# Altium integrated library Sajad_Altium_Library.IntLib: 390 symbols (part 2 of 3) (continued)
## Relay (continued)
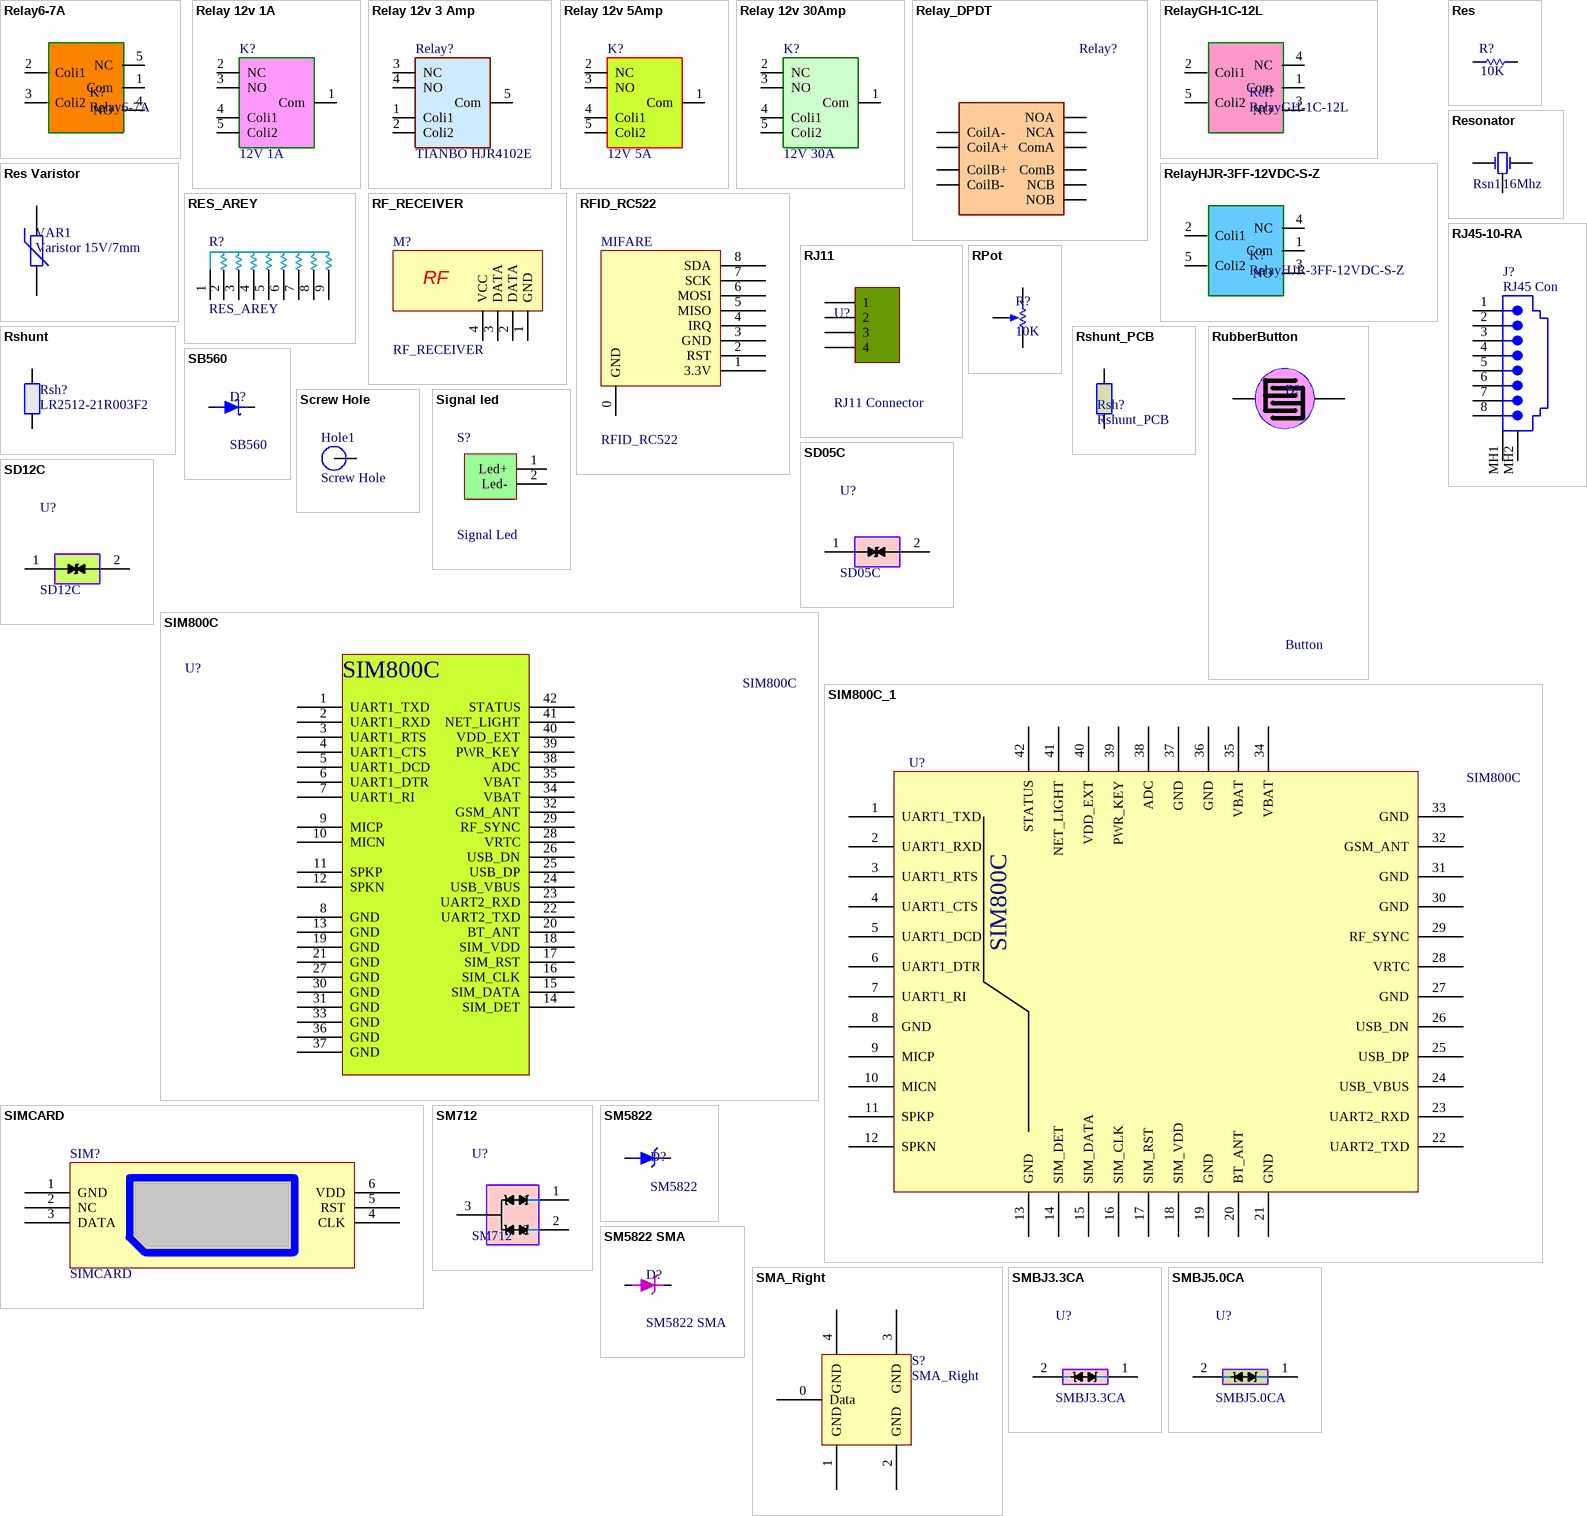
[diagram p12: symbols Relay6-7A to SMBJ5.0CA]

## Relay6-7A
designator K?
Single-Pole Dual-Throw Relay
footprint Relay Mini Milon
pins: 1 Com (power), 2 Coli1 (power), 3 Coli2 (power), 4 NO (power), 5 NC (power)

## Relay 12v 1A
designator K?, comment 12V 1A
12V 1A RELAY
footprint RELAY_12_CMD
pins: 1 Com (power), 2 NC (power), 3 NO (power), 4 Coli1 (power), 5 Coli2 (power)

## Relay 12v 3 Amp
designator Relay?, comment TIANBO HJR4102E
TIANBO 3A 12V RELAY
footprint TIANBO HJR4102E (TIANBO HJR4102E 12 v 3 A relay)
pins: 1 Coli1 (power), 2 Coli2 (power), 3 NC (power), 4 NO (power), 5 Com (power)

## Relay 12v 5Amp
designator K?, comment 12V 5A
12V 5A RELAY
footprint RELAY_12_10
pins: 1 Com (power), 2 NC (power), 3 NO (power), 4 Coli1 (power), 5 Coli2 (power)

## Relay 12v 30Amp
designator K?, comment 12V 30A
12V 30A RELAY
footprint RELAY_12_30
pins: 1 Com (power), 2 NC (power), 3 NO (power), 4 Coli1 (power), 5 Coli2 (power)

## Relay_DPDT
designator Relay?, comment JQC-16F  (value not drawn)
footprint RELAY_DOUBLE (JQC-16F)
pins: 1 CoilA+, 2 CoilA-, 3 NOA (power), 4 NCA (power), 5 ComA (power), 6 CoilB+, 7 CoilB-, 8 NOB (power), 9 NCB (power), 10 ComB (power)

## RelayGH-1C-12L
designator Rel?
HJR-3FF-12VDC-S-Z
footprint GH-1C-12L
pins: 1 Com (power), 2 Coli1 (power), 3 NO (power), 4 NC (power), 5 Coli2 (power)

## RelayHJR-3FF-12VDC-S-Z
designator K?
HJR-3FF-12VDC-S-Z
footprint HJR-3FF-12VDC-S-Z
pins: 1 Com (power), 2 Coli1 (power), 3 NO (power), 4 NC (power), 5 Coli2 (power)

## Res
designator R?, comment 10K
Resistor; Published: 8-Jun-2000; LatestRevisionDate: 17-Jul-2002; LatestRevisionNote: Re-released for DXP Platform.; PackageReference: AXIAL-0.3; Publisher: Altium Limited
footprint 0805
footprint 0603
footprint 1206_Res (1206 footprint)
footprint 0805 - big
footprint AXIAL-0.4 res (Axial Device, Thru-Hole; 2 Leads; 0.4 in Pin Spacing)
footprint RES20-16.5X6.5 (Resistor, Axial; Body 16.5 x 6.5 mm (LxDia. max), Lead Dia. 0.85 mm (max))
footprint 2512 (Footprint not found)
footprint 1225
footprint RES20 (Resistor, Axial; Body 16.5 x 6.5 mm (LxDia. max), Lead Dia. 0.85 mm (max))
footprint 0603 -sm
footprint AXIAL_KHAM-1W
footprint 0805_Medium
footprint RES_5W
pins: 1, 2

## Res Varistor
designator VAR1, comment Varistor 15V/7mm
Varistor (Voltage-Sensitive Resistor); Published: 24-Mar-1999; LatestRevisionDate: 29-May-2009; LatestRevisionNote: IPC-7351 Footprint Added.; PackageVersion: Mar-2003; PackageReference: 6-0805; Publisher: Altium Limited; PackageDescription: Chip Resistor 0805 Case Size; Code_IPC: RESC2012
footprint NTC0.3/.7
footprint 6-0805_L (Chip Resistor, Body 2.0x1.2mm, IPC High Density)
footprint 6-0805_M (Chip Resistor, Body 2.0x1.2mm, IPC Low Density)
pins: 1, 2

## RES_AREY
designator R?
footprint SIP9
pins: 1, 2, 3, 4, 5, 6, 7, 8, 9

## Resonator
designator Rsn1, comment 16Mhz
footprint RESONATOR
pins: 1 OSC1, 2 Gnd, 3 OSC2

## RF_RECEIVER
designator M?
footprint RF_RX
footprint RF_RX2
pins: 1 GND, 2 DATA, 3 DATA, 4 VCC
text: RF

## RFID_RC522
designator MIFARE
footprint RFID_RC522
pins: 0 GND, 1 3.3V, 2 RST, 3 GND, 4 IRQ, 5 MISO, 6 MOSI, 7 SCK, 8 SDA

## RJ11
designator U?, comment RJ11 Connector
RJ11; LatestRevisionDate: 17-Jul-2002; LatestRevisionNote: Re-released for DXP Platform.; Publisher: Altium Limited
footprint RJ11 (RJ11 CONNECTOR)
pins: 1, 2, 3, 4

## RJ45-10-RA
designator J?, comment RJ45 Con
Right Angle, Standard Profile, External Shield PCB Jack; Design Item Id: CON-RA-RJ45-95122-2881
footprint RJ-45 Connector (LAN Conector)
pins: 1, 2, 3, 4, 5, 6, 7, 8, MH1 Shield, MH2 Shield

## RPot
designator R?, comment 10K
Potentiometer
footprint SMD Pot (SMD Potentiometer)
footprint MultiTurn Pot (MultiTurn Potentiometer)
footprint Connector1x3 (Connector; Header; 3 Position)
footprint Potentiometer (potentiometer standing)
footprint POT4MM-2
pins: 1, 2, 3

## Rshunt
designator Rsh?, comment LR2512-21R003F2
Published: 8-Jun-2000; LatestRevisionDate: 17-Jul-2002; LatestRevisionNote: Re-released for DXP Platform.; PackageReference: AXIAL-0.3; Publisher: Altium Limited
footprint LR2512-21R003F2
pins: 1, 2

## Rshunt_PCB
designator Rsh?
Value: 3mOhm
footprint PCB_Shunt (3miliOhm)
footprint PCB_Shunt10m (10miliOhm)
pins: 1, 2

## RubberButton
designator B?, comment Button
Rubber button
footprint Button_Pad
pins: 1, 2

## SB560
designator D?
5 Amp Schottky Diode
footprint DO-201AD (Diode, Axial; Body 9.5 x 5.6 mm (LxDia. max), Lead Dia. 1.32 mm (max))
pins: 1 A, 2 K

## Screw Hole
designator Hole1  (no BOM)
footprint Hole_3mm-5mm
footprint Hole_4mm-5.5mm
pins: 1
2 alternate drawings of the same symbol

## SD05C
designator U?
Single Line TVS Diode for ESD  Protection
footprint 0805_MediumCap
pins: 1 "Speed", 2 "Speed"

## SD12C
designator U?
Single Line TVS Diode for ESD  Protection
footprint 0805_MediumCap
pins: 1 "Speed", 2 "Speed"

## Signal led
designator S?, comment Signal Led
footprint Signal LED (Signal_led)
pins: 1 Led+, 2 Led-

## SIM800C
designator U?
footprint SIM800C
pins: 1 UART1_TXD, 2 UART1_RXD, 3 UART1_RTS, 4 UART1_CTS, 5 UART1_DCD, 6 UART1_DTR, 7 UART1_RI, 8 GND, 9 MICP, 10 MICN, 11 SPKP, 12 SPKN, 13 GND, 14 SIM_DET, 15 SIM_DATA, 16 SIM_CLK, 17 SIM_RST, 18 SIM_VDD, 19 GND, 20 BT_ANT, 21 GND, 22 UART2_TXD, 23 UART2_RXD, 24 USB_VBUS, 25 USB_DP, 26 USB_DN, 27 GND, 28 VRTC, 29 RF_SYNC, 30 GND, 31 GND, 32 GSM_ANT, 33 GND, 34 VBAT, 35 VBAT, 36 GND, 37 GND, 38 ADC, 39 PWR_KEY, 40 VDD_EXT, 41 NET_LIGHT, 42 STATUS

## SIM800C_1
designator U?, comment SIM800C
footprint SIM800C
pins: 1 UART1_TXD, 2 UART1_RXD, 3 UART1_RTS, 4 UART1_CTS, 5 UART1_DCD, 6 UART1_DTR, 7 UART1_RI, 8 GND, 9 MICP, 10 MICN, 11 SPKP, 12 SPKN, 13 GND, 14 SIM_DET, 15 SIM_DATA, 16 SIM_CLK, 17 SIM_RST, 18 SIM_VDD, 19 GND, 20 BT_ANT, 21 GND, 22 UART2_TXD, 23 UART2_RXD, 24 USB_VBUS, 25 USB_DP, 26 USB_DN, 27 GND, 28 VRTC, 29 RF_SYNC, 30 GND, 31 GND, 32 GSM_ANT, 33 GND, 34 VBAT, 35 VBAT, 36 GND, 37 GND, 38 ADC, 39 PWR_KEY, 40 VDD_EXT, 41 NET_LIGHT, 42 STATUS

## SIMCARD
designator SIM?
footprint SIMCARD
pins: 1 GND, 2 NC, 3 DATA, 4 CLK, 5 RST, 6 VDD

## SM712
designator U?
TVS Diode for RS485; Link: http://javanelec.com/productsDetails.aspx?id=1540
footprint SOT23_
pins: 1 "Speed", 2 "Speed", 3 "Speed"

## SM5822
designator D?
3A Schottkey diode 40V
pins: 1 A, 2 K

## SM5822 SMA
designator D?
3 Amp Schottky Rectifier 40V; Link: http://www.javanelec.com/Shops/Index?searchFilter=ss34
footprint DO-214AA (DO-214AA (SMB))
pins: 1 A, 2 K

## SMA_Right
designator S?
footprint SMA_Right
pins: 0 Data, 1 GND, 2 GND, 3 GND, 4 GND

## SMBJ3.3CA
designator U?
TVS Diode for 3.3v; Link: javanElectronic; Price: 2625 Rial
footprint DO-214AC (1N4001-7 SMD DIODE)
pins: 1 "Speed", 2 "Speed"

## SMBJ5.0CA
designator U?
TVS Diode for 5v; Link: javanElectronic; Price: 2625 Rial
footprint DO-214AC (1N4001-7 SMD DIODE)
pins: 1 "Speed", 2 "Speed"

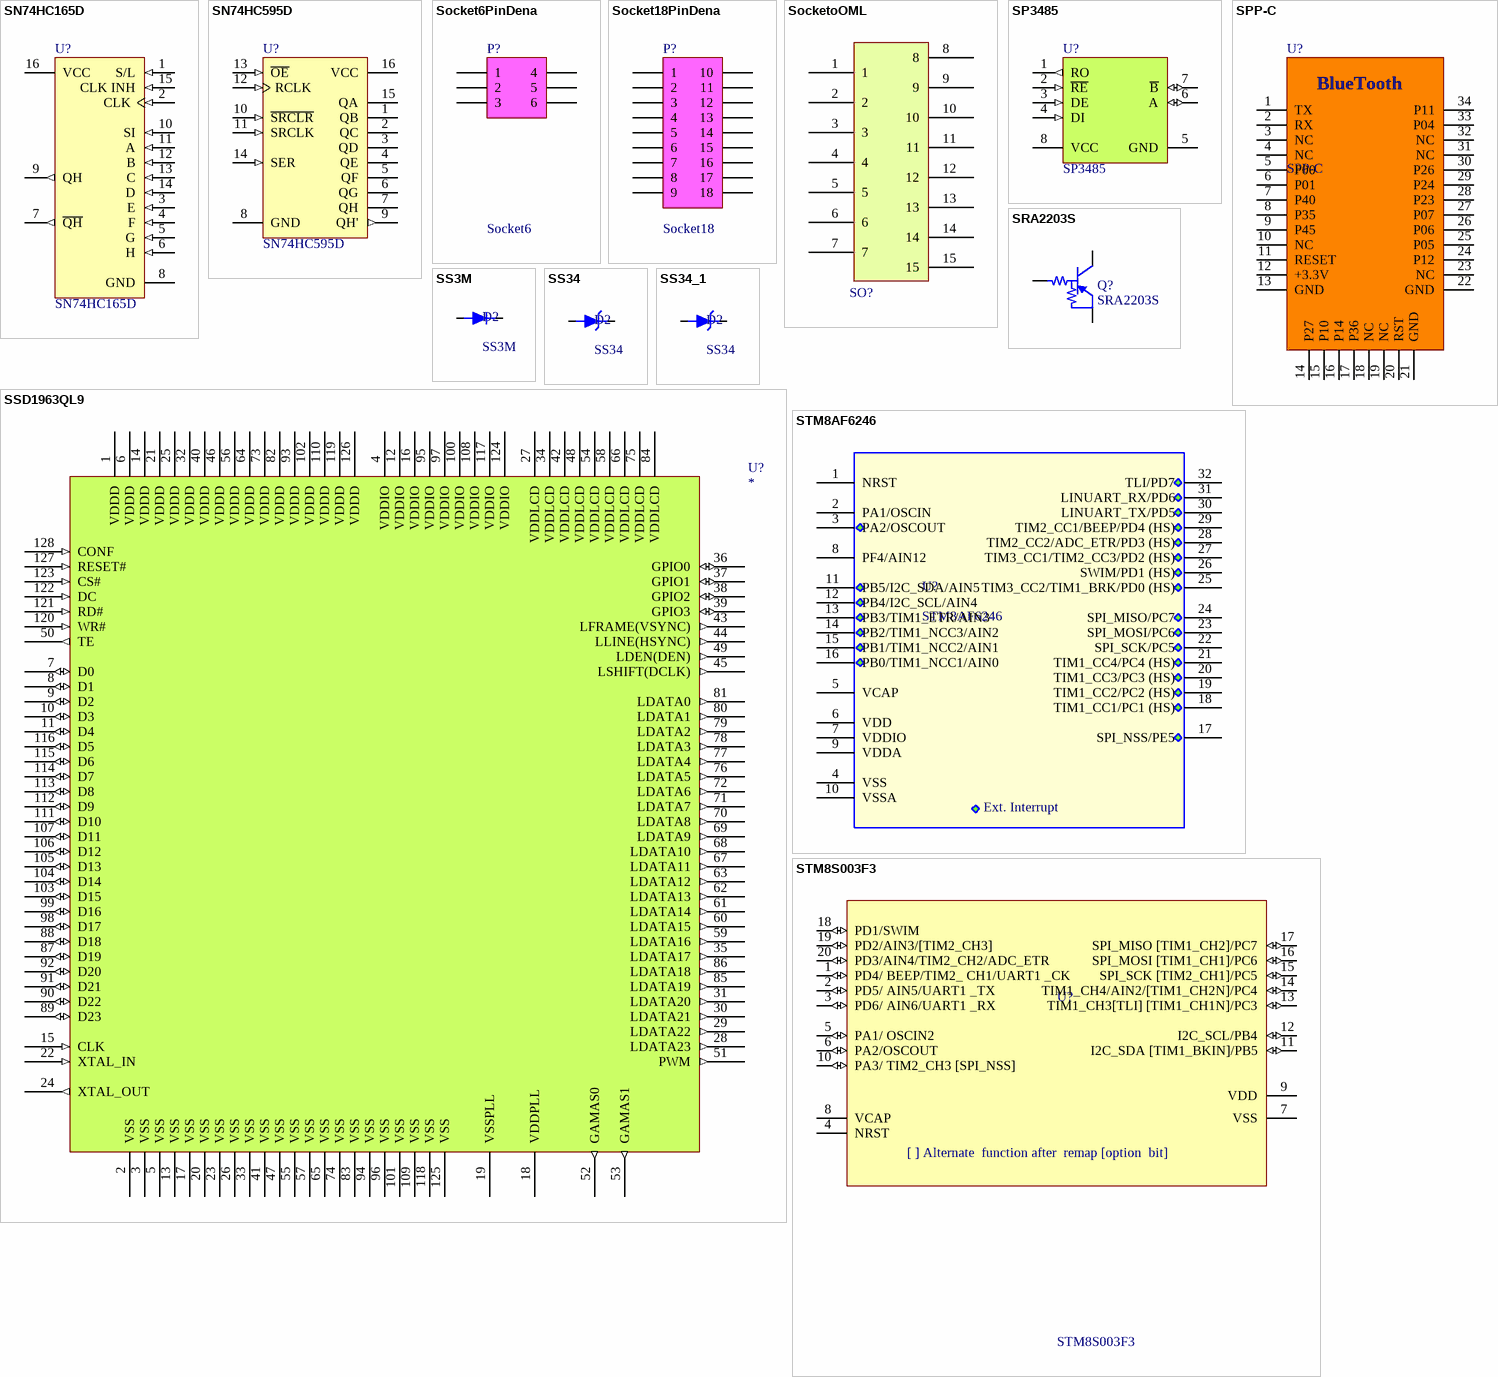
[diagram p13: symbols SN74HC165D to STM8S003F3]

## SN74HC165D
designator U?
8-Bit Parallel-Load Shift Register; Published: 8-Jun-2000; LatestRevisionDate: 13-Apr-2006; LatestRevisionNote: IPC-7351 Footprint Added.; DatasheetVersion: May-1997; PackageVersion: Jan-1998; PackageReference: D016; Publisher: Altium Limited; PackageDescription: 16-Pin Small Outline Integrated Circuit 1.27 mm Pitch; Code_IPC: SOIC127P600-16; ComponentLink1Description: Manufacturer Link; ComponentLink1URL: http://www.ti.com/; ComponentLink2Description: Datasheet; ComponentLink2URL: http://www-s.ti.com/sc/ds/sn74hc165.pdf
footprint SO16
pins: 1 S/L (in), 2 CLK (in), 3 E (in), 4 F (in), 5 G (in), 6 H (in), 7 ~{QH} (out), 8 GND (power), 9 QH (out), 10 SI (in), 11 A (in), 12 B (in), 13 C (in), 14 D (in), 15 CLK INH (in), 16 VCC (power)

## SN74HC595D
designator U?
8-Bit Shift Register with 3-State Output Registers; Published: 8-Jun-2000; LatestRevisionDate: 13-Apr-2006; LatestRevisionNote: IPC-7351 Footprint Added.; DatasheetVersion: May-1997; PackageVersion: Jan-1998; PackageReference: D016; Publisher: Altium Limited; PackageDescription: 16-Pin Small Outline Integrated Circuit 1.27 mm Pitch; Code_IPC: SOIC127P600-16; ComponentLink1Description: Manufacturer Link; ComponentLink1URL: http://www.ti.com/; ComponentLink2Description: Datasheet; ComponentLink2URL: http://www-s.ti.com/sc/ds/sn74hc595.pdf
footprint SO16
pins: 1 QB (hiz), 2 QC (hiz), 3 QD (hiz), 4 QE (hiz), 5 QF (hiz), 6 QG (hiz), 7 QH (hiz), 8 GND (power), 9 QH' (out), 10 ~{SRCLR} (in), 11 SRCLK (in), 12 RCLK (in), 13 ~{OE} (in), 14 SER (in), 15 QA (hiz), 16 VCC (power)

## Socket6PinDena
designator P?, comment Socket6
Socket 6 Pin for Dena & Samand
footprint Socket6Pin (for Dena & Samand Mirror)
pins: 1, 2, 3, 4, 5, 6

## Socket18PinDena
designator P?, comment Socket18
Socket 18 Pin for Dena & Samand
footprint Socket18Pin (for Dena & Samand Door)
pins: 1, 2, 3, 4, 5, 6, 7, 8, 9, 10, 11, 12, 13, 14, 15, 16, 17, 18

## SocketoOML
designator SO?, comment Socket  (value not drawn)
footprint SocketoOML
pins: 1, 2, 3, 4, 5, 6, 7, 8, 9, 10, 11, 12, 13, 14, 15

## SP3485
designator U?
+3.3V Low Power Half-Duplex RS-485   Transceiver with 10Mbps Data Rate; PartNumber: DS485M; Manufacturer: National Semiconductor; PackageTopMarking: NSZXTT*DS485*M; PowerWise: N; CompType: Interface IC; Published: 4-Dec-2008; DatasheetVersion: Jul-1998; PackageVersion: revM, May-2009; PackageReference: M08A; Publisher: Altium Limited; PackageDescription: SOIC Narrow, 4.9 x 3.9 x 1.45mm, 8 Lead, 1.27mm Pitch; Supplier 1: Farnell; Supplier Part Number 1: 9490078; RoHS: N; PinCount: 8; Code_JEDEC: MS-012-AA; Code_IPC: SOIC127P600-8; ComponentLink1Description: DS485 Datasheet; ComponentLink1URL: http://www.national.com/ds/DS/DS485.pdf; ComponentLink2Description: DS485 Web Page; ComponentLink2URL: http://www.national.com/pf/DS/DS485.html; ComponentLink3Description: M08A Package Page; ComponentLink3URL: http://www.national.com/packaging/folders/m08a.html
footprint SO8
pins: 1 RO (out), 2 ~{RE} (in), 3 DE (in), 4 DI (in), 5 GND (power), 6 A (io), 7 ~{B} (io), 8 VCC (power)

## SPP-C
designator U?
Bluetooth Serial Module
footprint SPP-C (Bluetooth module footprint)
pins: 1 TX, 2 RX, 3 NC, 4 NC, 5 P00, 6 P01, 7 P40, 8 P35, 9 P45, 10 NC, 11 RESET, 12 +3.3V, 13 GND, 14 P27, 15 P10, 16 P14, 17 P36, 18 NC, 19 NC, 20 RST, 21 GND, 22 GND, 23 NC, 24 P12, 25 P05, 26 P06, 27 P07, 28 P23, 29 P24, 30 P26, 31 NC, 32 NC, 33 P04, 34 P11
text: BlueTooth

## SRA2203S
designator Q?
PNP Silicon Transistor With built-in bias resistors
footprint SOT23_
pins: 1 B, 2 E, 3 C

## SS3M
designator D2
3A Schottkey diode
footprint DIODE - SMC
pins: 1 A, 2 K

## SS34
designator D2
3A Schottkey diode
footprint DIODE - SMC
pins: 1 A, 2 K

## SS34_1
designator D2, comment SS34
3A Schottkey diode
footprint DIODE - SMC
pins: 1 A, 2 K

## SSD1963QL9
designator U?
SSD1963QL9
footprint LQFP128
pins: 1 VDDD, 2 VSS, 3 VSS, 4 VDDIO, 5 VSS, 6 VDDD, 7 D0 (io), 8 D1 (io), 9 D2 (io), 10 D3 (io), 11 D4 (io), 12 VDDIO, 13 VSS, 14 VDDD, 15 CLK (in), 16 VDDIO, 17 VSS, 18 VDDPLL, 19 VSSPLL, 20 VSS, 21 VDDD, 22 XTAL_IN (in), 23 VSS, 24 XTAL_OUT (out), 25 VDDD, 26 VSS, 27 VDDLCD, 28 LDATA23 (out), 29 LDATA22 (out), 30 LDATA21 (out), 31 LDATA20 (out), 32 VDDD, 33 VSS, 34 VDDLCD, 35 LDATA17 (out), 36 GPIO0 (io), 37 GPIO1 (io), 38 GPIO2 (io), 39 GPIO3 (io), 40 VDDD, 41 VSS, 42 VDDLCD, 43 LFRAME(VSYNC) (out), 44 LLINE(HSYNC) (out), 45 LSHIFT(DCLK) (out), 46 VDDD, 47 VSS, 48 VDDLCD, 49 LDEN(DEN) (out), 50 TE (out), 51 PWM (out), 52 GAMAS0 (out), 53 GAMAS1 (out), 54 VDDLCD, 55 VSS, 56 VDDD, 57 VSS, 58 VDDLCD, 59 LDATA16 (out), 60 LDATA15 (out), 61 LDATA14 (out), 62 LDATA13 (out), 63 LDATA12 (out), 64 VDDD, 65 VSS, 66 VDDLCD, 67 LDATA11 (out), 68 LDATA10 (out), 69 LDATA9 (out), 70 LDATA8 (out), 71 LDATA7 (out), 72 LDATA6 (out), 73 VDDD, 74 VSS, 75 VDDLCD, 76 LDATA5 (out), 77 LDATA4 (out), 78 LDATA3 (out), 79 LDATA2 (out), 80 LDATA1 (out), 81 LDATA0 (out), 82 VDDD, 83 VSS, 84 VDDLCD, 85 LDATA19 (out), 86 LDATA18 (out), 87 D19 (io), 88 D18 (io), 89 D23 (io), 90 D22 (io), 91 D21 (io), 92 D20 (io), 93 VDDD, 94 VSS, 95 VDDIO, 96 VSS, 97 VDDIO, 98 D17 (io), 99 D16 (io), 100 VDDIO, 101 VSS, 102 VDDD, 103 D15 (io), 104 D14 (io), 105 D13 (io), 106 D12 (io), 107 D11 (io), 108 VDDIO, 109 VSS, 110 VDDD, 111 D10 (io), 112 D9 (io), 113 D8 (io), 114 D7 (io), 115 D6 (io), 116 D5 (io), 117 VDDIO, 118 VSS, 119 VDDD, 120 WR# (in), 121 RD# (in), 122 DC (in), 123 CS# (in), 124 VDDIO, 125 VSS, 126 VDDD, 127 RESET# (in), 128 CONF (in)

## STM8AF6246
designator U?
footprint LQFP32 (32-Pin Thin Quad Flat Pack 0.8 mm Pitch)
pins: 1 NRST, 2 PA1/OSCIN, 3 PA2/OSCOUT, 4 VSS, 5 VCAP, 6 VDD, 7 VDDIO, 8 PF4/AIN12, 9 VDDA, 10 VSSA, 11 PB5/I2C_SDA/AIN5, 12 PB4/I2C_SCL/AIN4, 13 PB3/TIM1_ETR/AIN3, 14 PB2/TIM1_NCC3/AIN2, 15 PB1/TIM1_NCC2/AIN1, 16 PB0/TIM1_NCC1/AIN0, 17 SPI_NSS/PE5, 18 TIM1_CC1/PC1 (HS), 19 TIM1_CC2/PC2 (HS), 20 TIM1_CC3/PC3 (HS), 21 TIM1_CC4/PC4 (HS), 22 SPI_SCK/PC5, 23 SPI_MOSI/PC6, 24 SPI_MISO/PC7, 25 TIM3_CC2/TIM1_BRK/PD0 (HS), 26 SWIM/PD1 (HS), 27 TIM3_CC1/TIM2_CC3/PD2 (HS), 28 TIM2_CC2/ADC_ETR/PD3 (HS), 29 TIM2_CC1/BEEP/PD4 (HS), 30 LINUART_TX/PD5, 31 LINUART_RX/PD6, 32 TLI/PD7
text: Ext. Interrupt

## STM8S003F3
designator U?
8-Bit ST Microcontroller with 8K Bytes Flash
footprint TSSOP 20 (20-pin, 4.40 mm body, 0.65 mm pitch)
pins: 1 PD4/ BEEP/TIM2_ CH1/UART1 _CK (io), 2 PD5/ AIN5/UART1 _TX (io), 3 PD6/ AIN6/UART1 _RX (io), 4 NRST, 5 PA1/ OSCIN2 (io), 6 PA2/OSCOUT (io), 7 VSS, 8 VCAP, 9 VDD, 10 PA3/ TIM2_CH3 [SPI_NSS] (io), 11 I2C_SDA [TIM1_BKIN]/PB5 (io), 12 I2C_SCL/PB4 (io), 13 TIM1_CH3[TLI] [TIM1_CH1N]/PC3 (io), 14 TIM1_CH4/AIN2/[TIM1_CH2N]/PC4 (io), 15 SPI_SCK [TIM2_CH1]/PC5 (io), 16 SPI_MOSI [TIM1_CH1]/PC6 (io), 17 SPI_MISO [TIM1_CH2]/PC7 (io), 18 PD1/SWIM (io), 19 PD2/AIN3/[TIM2_CH3] (io), 20 PD3/AIN4/TIM2_CH2/ADC_ETR (io)
text: [ ] Alternate  function after  remap [option  bit]

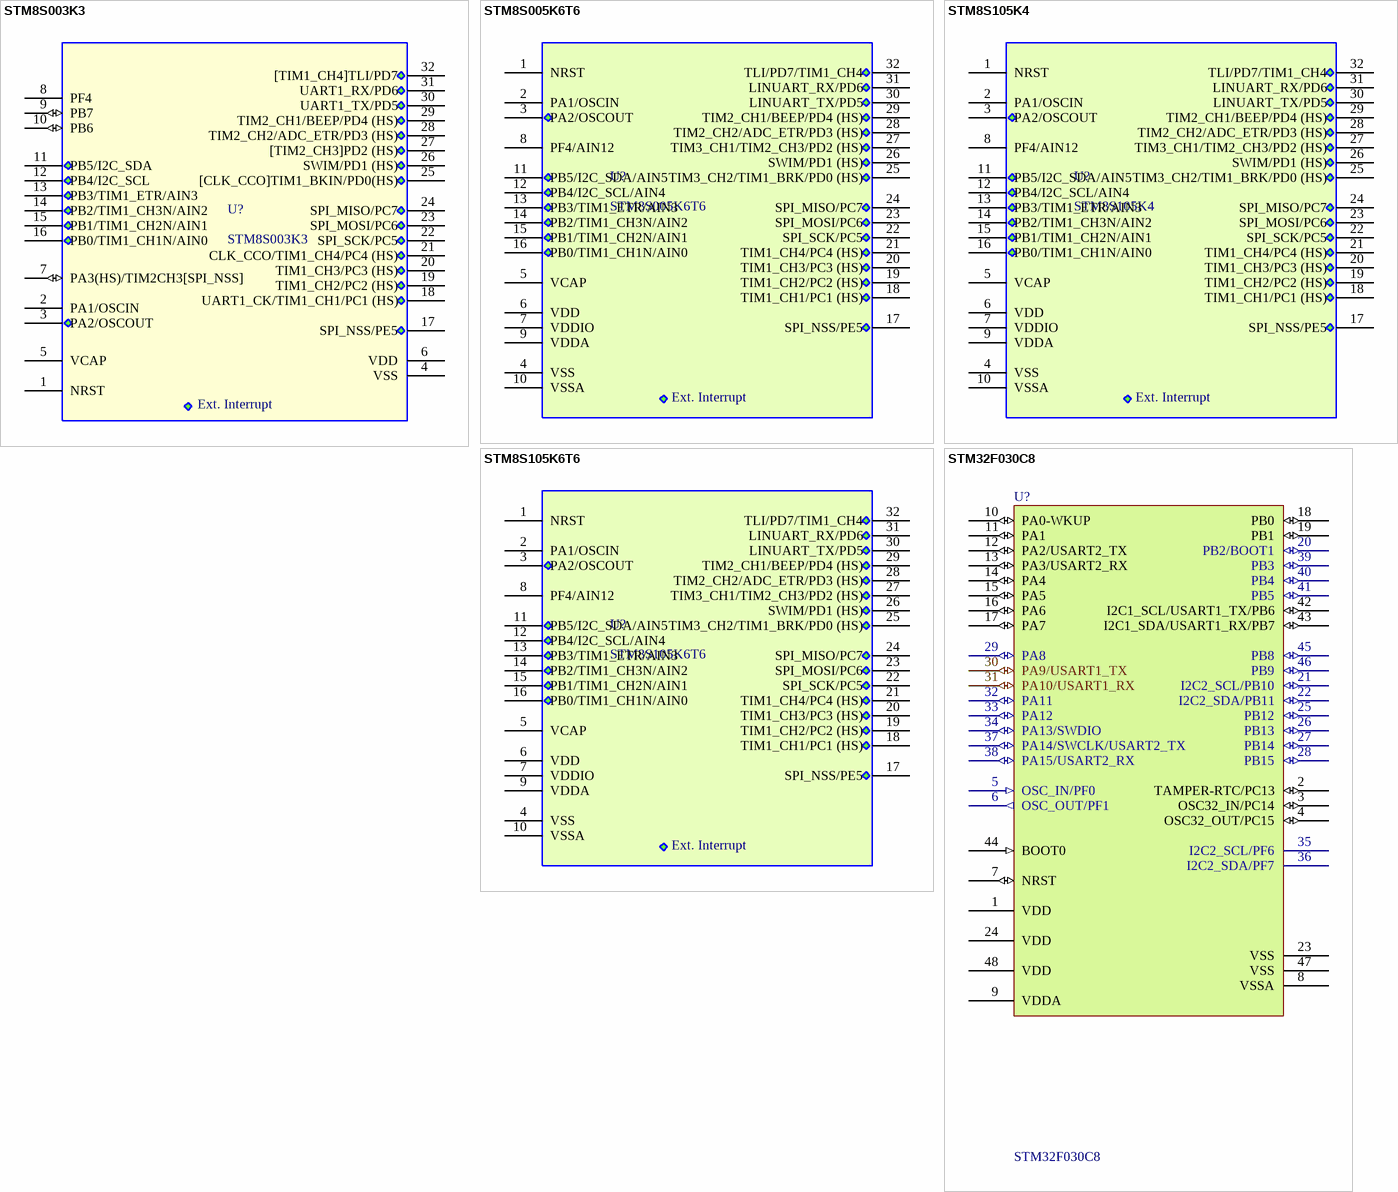
[diagram p14: symbols STM8S003K3 to STM32F030C8]

## STM8S003K3
designator U?
Value line, 16 MHz STM8S 8-bit MCU, 8 Kbytes Flash, 128 bytes  data EEPROM, 10-bit ADC, 3 timers, UART, SPI, I2C
footprint LQFP32 (32-Pin Thin Quad Flat Pack 0.8 mm Pitch)
pins: 1 NRST, 2 PA1/OSCIN, 3 PA2/OSCOUT, 4 VSS, 5 VCAP, 6 VDD, 7 PA3(HS)/TIM2CH3[SPI_NSS] (io), 8 PF4, 9 PB7 (io), 10 PB6 (io), 11 PB5/I2C_SDA, 12 PB4/I2C_SCL, 13 PB3/TIM1_ETR/AIN3, 14 PB2/TIM1_CH3N/AIN2, 15 PB1/TIM1_CH2N/AIN1, 16 PB0/TIM1_CH1N/AIN0, 17 SPI_NSS/PE5, 18 UART1_CK/TIM1_CH1/PC1 (HS), 19 TIM1_CH2/PC2 (HS), 20 TIM1_CH3/PC3 (HS), 21 CLK_CCO/TIM1_CH4/PC4 (HS), 22 SPI_SCK/PC5, 23 SPI_MOSI/PC6, 24 SPI_MISO/PC7, 25 [CLK_CCO]TIM1_BKIN/PD0(HS), 26 SWIM/PD1 (HS), 27 [TIM2_CH3]PD2 (HS), 28 TIM2_CH2/ADC_ETR/PD3 (HS), 29 TIM2_CH1/BEEP/PD4 (HS), 30 UART1_TX/PD5, 31 UART1_RX/PD6, 32 [TIM1_CH4]TLI/PD7
text: Ext. Interrupt

## STM8S005K6T6
designator U?
MCU 8-bit 32KB Flash 16 MHz STM8 LQFP32; FindsChip.com: http://www.findchips.com/search/STM8S005k6t6; Price: 0.7$
footprint LQFP32 (32-Pin Thin Quad Flat Pack 0.8 mm Pitch)
pins: 1 NRST, 2 PA1/OSCIN, 3 PA2/OSCOUT, 4 VSS, 5 VCAP, 6 VDD, 7 VDDIO, 8 PF4/AIN12, 9 VDDA, 10 VSSA, 11 PB5/I2C_SDA/AIN5, 12 PB4/I2C_SCL/AIN4, 13 PB3/TIM1_ETR/AIN3, 14 PB2/TIM1_CH3N/AIN2, 15 PB1/TIM1_CH2N/AIN1, 16 PB0/TIM1_CH1N/AIN0, 17 SPI_NSS/PE5, 18 TIM1_CH1/PC1 (HS), 19 TIM1_CH2/PC2 (HS), 20 TIM1_CH3/PC3 (HS), 21 TIM1_CH4/PC4 (HS), 22 SPI_SCK/PC5, 23 SPI_MOSI/PC6, 24 SPI_MISO/PC7, 25 TIM3_CH2/TIM1_BRK/PD0 (HS), 26 SWIM/PD1 (HS), 27 TIM3_CH1/TIM2_CH3/PD2 (HS), 28 TIM2_CH2/ADC_ETR/PD3 (HS), 29 TIM2_CH1/BEEP/PD4 (HS), 30 LINUART_TX/PD5, 31 LINUART_RX/PD6, 32 TLI/PD7/TIM1_CH4
text: Ext. Interrupt

## STM8S105K4
designator U?
MCU 8-bit 16KB Flash 16 MHz STM8 LQFP32 EEPROM; Javan Electronic: http://www.kavirelectronic.ir/eshop/%D9%85%DB%8C%DA%A9%D8%B1%D9%88%DA%A9%D9%86%D8%AA%D8%B1%D9%84%D8%B1-stm8/1200232--stm8s105k4t6c-.html; Price: 3900 toman; FindsChip Link: http://www.findchips.com/search/STM8S105K4T6C
footprint LQFP32 (32-Pin Thin Quad Flat Pack 0.8 mm Pitch)
pins: 1 NRST, 2 PA1/OSCIN, 3 PA2/OSCOUT, 4 VSS, 5 VCAP, 6 VDD, 7 VDDIO, 8 PF4/AIN12, 9 VDDA, 10 VSSA, 11 PB5/I2C_SDA/AIN5, 12 PB4/I2C_SCL/AIN4, 13 PB3/TIM1_ETR/AIN3, 14 PB2/TIM1_CH3N/AIN2, 15 PB1/TIM1_CH2N/AIN1, 16 PB0/TIM1_CH1N/AIN0, 17 SPI_NSS/PE5, 18 TIM1_CH1/PC1 (HS), 19 TIM1_CH2/PC2 (HS), 20 TIM1_CH3/PC3 (HS), 21 TIM1_CH4/PC4 (HS), 22 SPI_SCK/PC5, 23 SPI_MOSI/PC6, 24 SPI_MISO/PC7, 25 TIM3_CH2/TIM1_BRK/PD0 (HS), 26 SWIM/PD1 (HS), 27 TIM3_CH1/TIM2_CH3/PD2 (HS), 28 TIM2_CH2/ADC_ETR/PD3 (HS), 29 TIM2_CH1/BEEP/PD4 (HS), 30 LINUART_TX/PD5, 31 LINUART_RX/PD6, 32 TLI/PD7/TIM1_CH4
text: Ext. Interrupt

## STM8S105K6T6
designator U?
MCU 8-bit 32KB Flash 16 MHz STM8 LQFP32 EEPROM
footprint LQFP32 (32-Pin Thin Quad Flat Pack 0.8 mm Pitch)
pins: 1 NRST, 2 PA1/OSCIN, 3 PA2/OSCOUT, 4 VSS, 5 VCAP, 6 VDD, 7 VDDIO, 8 PF4/AIN12, 9 VDDA, 10 VSSA, 11 PB5/I2C_SDA/AIN5, 12 PB4/I2C_SCL/AIN4, 13 PB3/TIM1_ETR/AIN3, 14 PB2/TIM1_CH3N/AIN2, 15 PB1/TIM1_CH2N/AIN1, 16 PB0/TIM1_CH1N/AIN0, 17 SPI_NSS/PE5, 18 TIM1_CH1/PC1 (HS), 19 TIM1_CH2/PC2 (HS), 20 TIM1_CH3/PC3 (HS), 21 TIM1_CH4/PC4 (HS), 22 SPI_SCK/PC5, 23 SPI_MOSI/PC6, 24 SPI_MISO/PC7, 25 TIM3_CH2/TIM1_BRK/PD0 (HS), 26 SWIM/PD1 (HS), 27 TIM3_CH1/TIM2_CH3/PD2 (HS), 28 TIM2_CH2/ADC_ETR/PD3 (HS), 29 TIM2_CH1/BEEP/PD4 (HS), 30 LINUART_TX/PD5, 31 LINUART_RX/PD6, 32 TLI/PD7/TIM1_CH4
text: Ext. Interrupt

## STM32F030C8
designator U?
ARM Cortex-M0 32-bit RISC core (48 MHz max), 64kB Flash, 8 kB Internal RAM, -40 to +85°C, 48-Pin LQFP, Tray; ComponentLink1URL: http://www.st.com/
footprint TQFP48_M (48-Pin Thin Quad Flat Pack 0.5 mm Pitch, IPC Low Density)
pins: 1 VDD (power), 2 TAMPER-RTC/PC13 (io), 3 OSC32_IN/PC14 (io), 4 OSC32_OUT/PC15 (io), 5 OSC_IN/PF0 (in), 6 OSC_OUT/PF1 (out), 7 NRST (io), 8 VSSA (power), 9 VDDA (power), 10 PA0-WKUP (io), 11 PA1 (io), 12 PA2/USART2_TX (io), 13 PA3/USART2_RX (io), 14 PA4 (io), 15 PA5 (io), 16 PA6 (io), 17 PA7 (io), 18 PB0 (io), 19 PB1 (io), 20 PB2/BOOT1 (io), 21 I2C2_SCL/PB10 (io), 22 I2C2_SDA/PB11 (io), 23 VSS (power), 24 VDD (power), 25 PB12 (io), 26 PB13 (io), 27 PB14 (io), 28 PB15 (io), 29 PA8 (io), 30 PA9/USART1_TX (io), 31 PA10/USART1_RX (io), 32 PA11 (io), 33 PA12 (io), 34 PA13/SWDIO (io), 35 I2C2_SCL/PF6 (power), 36 I2C2_SDA/PF7 (power), 37 PA14/SWCLK/USART2_TX (io), 38 PA15/USART2_RX (io), 39 PB3 (io), 40 PB4 (io), 41 PB5 (io), 42 I2C1_SCL/USART1_TX/PB6 (io), 43 I2C1_SDA/USART1_RX/PB7 (io), 44 BOOT0 (in), 45 PB8 (io), 46 PB9 (io), 47 VSS (power), 48 VDD (power)

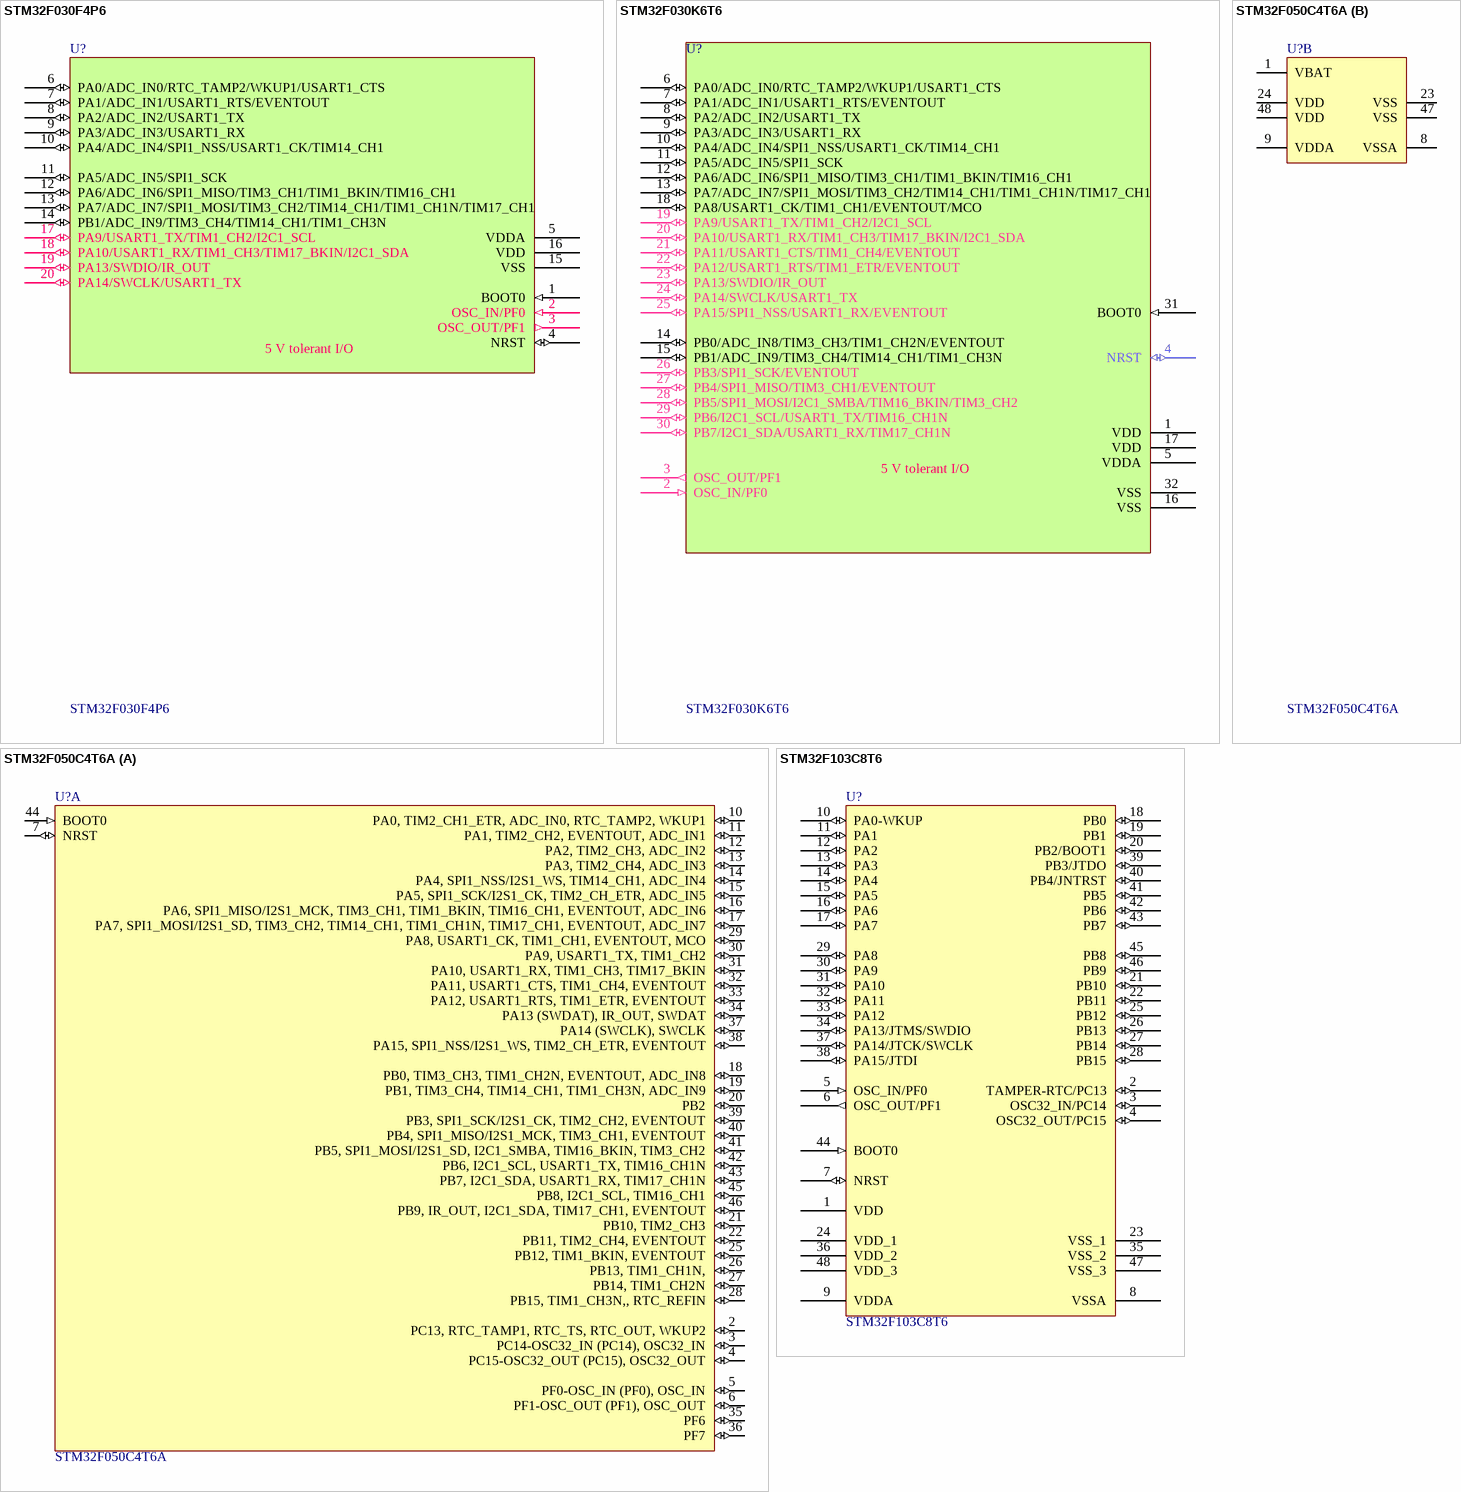
[diagram p15: symbols STM32F030F4P6 to STM32F103C8T6]

## STM32F030F4P6
designator U?
ARM Microcontrollers - MCU Value-Line ARM MCU 16kB 48 MHz; Link: http://javanelec.com/productsDetails.aspx?id=32659
footprint TSSOP20 (TSSOP 20 Pin)
pins: 1 BOOT0 (in), 2 OSC_IN/PF0 (in), 3 OSC_OUT/PF1 (out), 4 NRST (io), 5 VDDA (power), 6 PA0/ADC_IN0/RTC_TAMP2/WKUP1/USART1_CTS (io), 7 PA1/ADC_IN1/USART1_RTS/EVENTOUT (io), 8 PA2/ADC_IN2/USART1_TX (io), 9 PA3/ADC_IN3/USART1_RX (io), 10 PA4/ADC_IN4/SPI1_NSS/USART1_CK/TIM14_CH1 (io), 11 PA5/ADC_IN5/SPI1_SCK (io), 12 PA6/ADC_IN6/SPI1_MISO/TIM3_CH1/TIM1_BKIN/TIM16_CH1 (io), 13 PA7/ADC_IN7/SPI1_MOSI/TIM3_CH2/TIM14_CH1/TIM1_CH1N/TIM17_CH1 (io), 14 PB1/ADC_IN9/TIM3_CH4/TIM14_CH1/TIM1_CH3N (io), 15 VSS (power), 16 VDD (power), 17 PA9/USART1_TX/TIM1_CH2/I2C1_SCL (io), 18 PA10/USART1_RX/TIM1_CH3/TIM17_BKIN/I2C1_SDA (io), 19 PA13/SWDIO/IR_OUT (io), 20 PA14/SWCLK/USART1_TX (io)
text: 5 V tolerant I/O

## STM32F030K6T6
designator U?
ARM Microcontrollers - MCU Value-Line ARM MCU 32kB 48 MHz; Link: http://javanelec.com/productsDetails.aspx?id=32660
footprint LQFP32 (32-Pin Thin Quad Flat Pack 0.8 mm Pitch)
pins: 1 VDD (power), 2 OSC_IN/PF0 (in), 3 OSC_OUT/PF1 (out), 4 NRST (io), 5 VDDA (power), 6 PA0/ADC_IN0/RTC_TAMP2/WKUP1/USART1_CTS (io), 7 PA1/ADC_IN1/USART1_RTS/EVENTOUT (io), 8 PA2/ADC_IN2/USART1_TX (io), 9 PA3/ADC_IN3/USART1_RX (io), 10 PA4/ADC_IN4/SPI1_NSS/USART1_CK/TIM14_CH1 (io), 11 PA5/ADC_IN5/SPI1_SCK (io), 12 PA6/ADC_IN6/SPI1_MISO/TIM3_CH1/TIM1_BKIN/TIM16_CH1 (io), 13 PA7/ADC_IN7/SPI1_MOSI/TIM3_CH2/TIM14_CH1/TIM1_CH1N/TIM17_CH1 (io), 14 PB0/ADC_IN8/TIM3_CH3/TIM1_CH2N/EVENTOUT (io), 15 PB1/ADC_IN9/TIM3_CH4/TIM14_CH1/TIM1_CH3N (io), 16 VSS (power), 17 VDD (power), 18 PA8/USART1_CK/TIM1_CH1/EVENTOUT/MCO (io), 19 PA9/USART1_TX/TIM1_CH2/I2C1_SCL (io), 20 PA10/USART1_RX/TIM1_CH3/TIM17_BKIN/I2C1_SDA (io), 21 PA11/USART1_CTS/TIM1_CH4/EVENTOUT (io), 22 PA12/USART1_RTS/TIM1_ETR/EVENTOUT (io), 23 PA13/SWDIO/IR_OUT (io), 24 PA14/SWCLK/USART1_TX (io), 25 PA15/SPI1_NSS/USART1_RX/EVENTOUT (io), 26 PB3/SPI1_SCK/EVENTOUT (io), 27 PB4/SPI1_MISO/TIM3_CH1/EVENTOUT (io), 28 PB5/SPI1_MOSI/I2C1_SMBA/TIM16_BKIN/TIM3_CH2 (io), 29 PB6/I2C1_SCL/USART1_TX/TIM16_CH1N (io), 30 PB7/I2C1_SDA/USART1_RX/TIM17_CH1N (io), 31 BOOT0 (in), 32 VSS (power)
text: 5 V tolerant I/O